# Altium footprint library NEW.PcbLib: 53 footprints (part 1 of 4)
Each footprint in its own frame and in the unit in brackets; x right, y up, seen from the top. Pads: shape width x height; smd on the part's side, far side on the other; paste and mask are expansions set on the pad; w line width, h text height; cw(c..) or ccw(c..) is an arc to the next point about the centre after c.
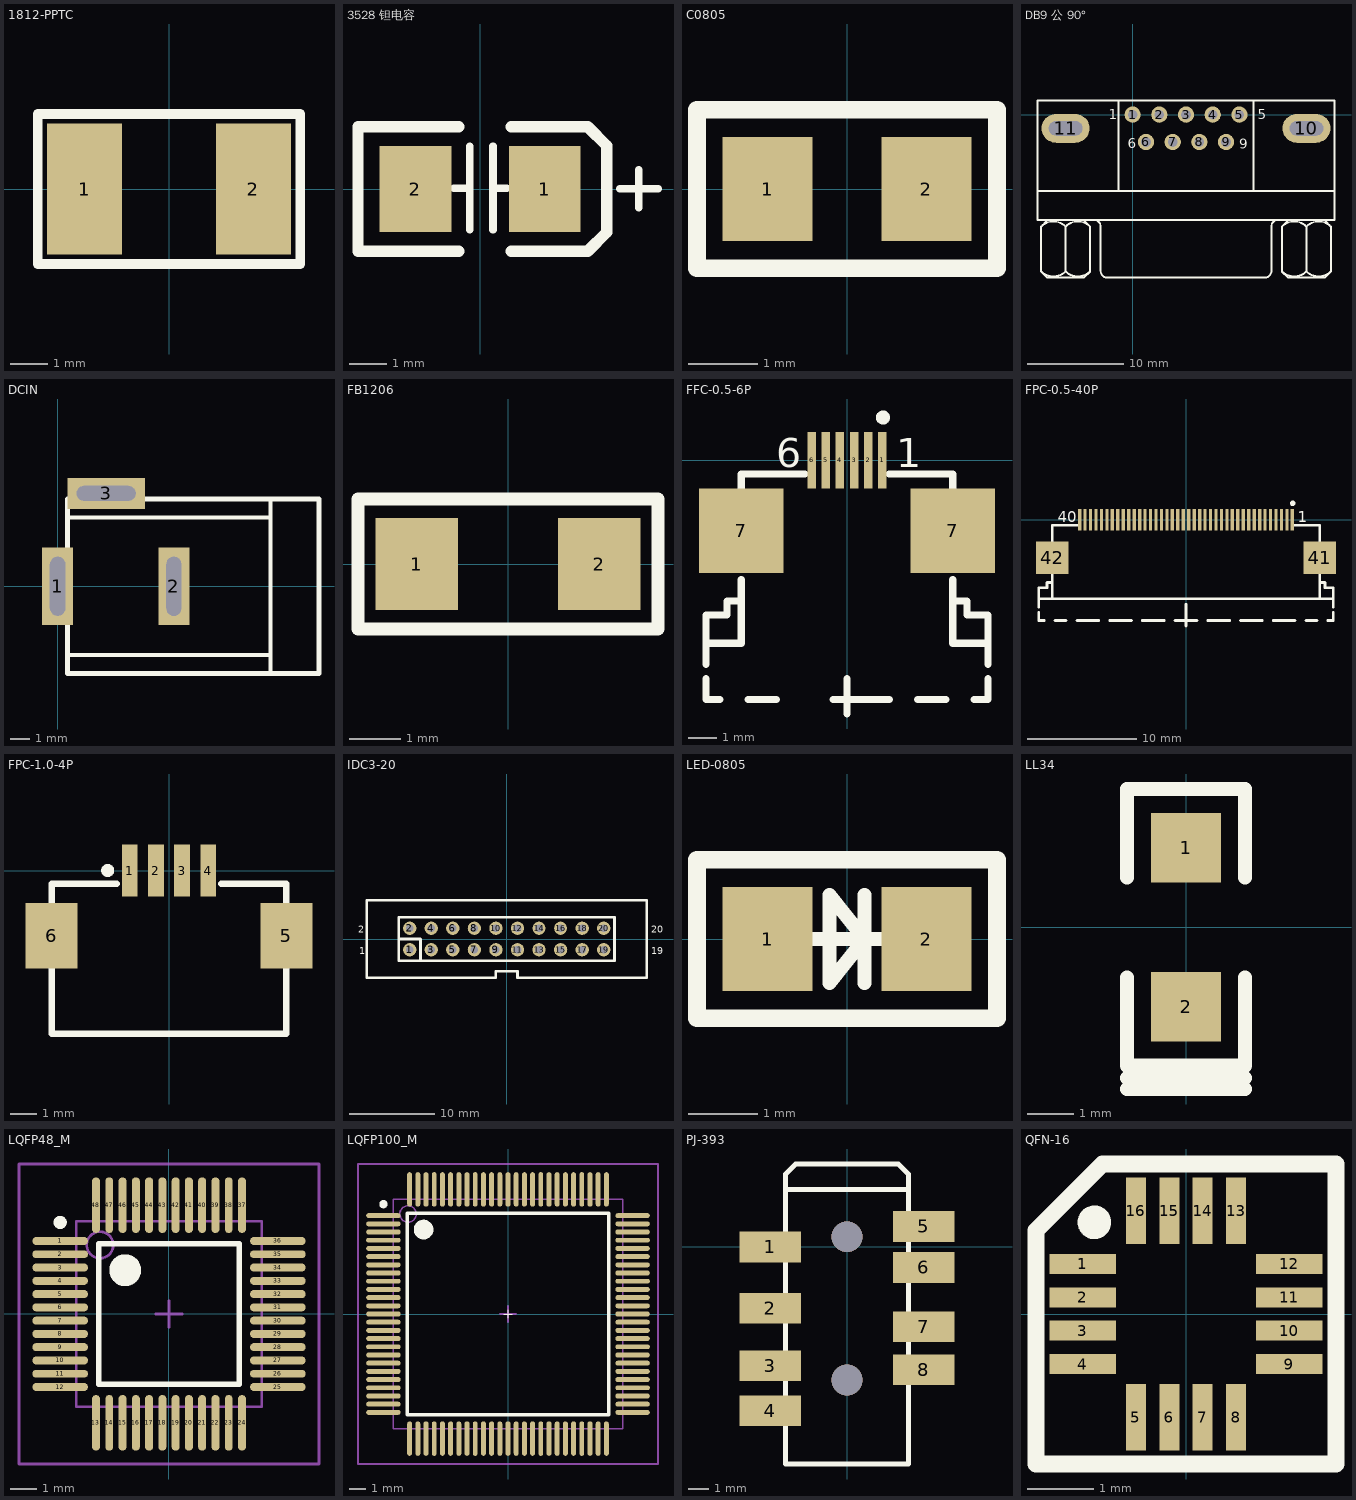
[diagram p0: the footprints below, top view; thin cyan lines are the x and y axes]

## 1812-PPTC [mm]
height 1
pads (2):
  rect 2x3.5 smd: 1(-2.25,0) 2(2.25,0)
Top Overlay:
  lines w0.254: -3.5,-2 -3.5,2 3.5,2 3.5,-2 -3.5,-2
3D body: height 1.32, standoff 0, extent -2.41,-1.61 2.41,1.61

## 3528 钽电容 [mil]
height 118.11
pads (2):
  rect 75x90 smd: 1(67.5,0) 2(-67.5,0)
Top Overlay:
  lines w7.87: 145.85,0.2 185.85,0.2 ; 165.85,-19.8 165.85,20.2
  lines w8: -27.38,0.79 -10.65,0.79 ; -10.65,-42.72 -10.65,44.69 ; 13.56,-42.72 13.56,44.69 ; 13.56,0.79 27.74,0.79
  lines w12: -22.5,-65 -127.5,-65 -127.5,65 -22.5,65 ; 32.5,-65 112.5,-65 132.5,-45 132.5,45 112.5,65 32.5,65
3D body: height 82.22, standoff -0.46, extent -72.65,-55.51 72.65,55.51

## C0805 [mm]
height 0.5
pads (2):
  rect 1.3x1.5 smd: 1(-1.143,0) 2(1.143,0)
Top Overlay:
  lines w0.254: -2.159,-1.143 2.159,-1.143 2.159,0.508 2.159,1.143 -2.159,1.143 -2.159,0.635 -2.159,-1.143
3D body: height 0.6, standoff 0, extent -1,-0.625 1,0.625

## DB9 公 90° [mm]
height 12.5
pads (11):
  round 1.69 hole 1: 1(0,0) 2(2.77,0) 3(5.54,0) 4(8.31,0) 5(11.08,0) 6(1.385,-2.84) 7(4.155,-2.84) 8(6.925,-2.84) 9(9.695,-2.84)
  oval 5x3 hole 1.5 slot 3.5 at 0 deg: 10(18.035,-1.42) 11(-6.955,-1.42)
Top Overlay:
  lines w0.2: -9.86,-7.92 20.94,-7.92 ; -9.502,-16.285 -8.867,-16.92 -5.057,-16.92 -4.422,-16.285 ; -9.502,-16.27 -9.502,-11.619 -8.867,-10.984 ; -9.502,-15.218 -9.502,-15.006 ; -6.962,-16.27 -6.962,-11.619 ; -5.057,-10.984 -4.422,-11.619 -4.422,-16.27 ; -4.02,-10.925 cw(c-4.02,-11.62) -3.325,-11.62 -3.325,-16.22 ; -3.32,-16.225 ccw(c-2.625,-16.225) -2.625,-16.92 13.705,-16.92 ccw(c13.705,-16.225) 14.4,-16.225 ; -1.46,-7.92 -1.46,1.48 ; 12.54,-7.92 12.54,1.48 ; 14.405,-16.22 14.405,-11.62 cw(c15.1,-11.62) 15.1,-10.925 ; 15.498,-16.285 16.133,-16.92 19.943,-16.92 20.578,-16.285 ; 15.498,-16.27 15.498,-11.619 16.133,-10.984 ; 15.498,-15.218 15.498,-15.006 ; 18.038,-16.27 18.038,-11.619 ; 19.943,-10.984 20.578,-11.619 20.578,-16.27 ; -9.86,-10.92 -9.86,1.48 20.94,1.48 20.94,-10.92 -9.86,-10.92
  lines w0.203: -9.504,-11.617 cw(c-8.232,-12.889) -6.96,-11.617 ; -9.502,-16.27 ccw(c-8.23,-14.998) -6.958,-16.27 ; -6.967,-16.27 ccw(c-5.694,-14.998) -4.422,-16.27 ; -6.964,-11.617 cw(c-5.692,-12.889) -4.42,-11.617 ; 15.496,-11.617 cw(c16.768,-12.889) 18.04,-11.617 ; 15.498,-16.27 ccw(c16.77,-14.998) 18.042,-16.27 ; 18.033,-16.27 ccw(c19.306,-14.998) 20.578,-16.27 ; 18.036,-11.617 cw(c19.308,-12.889) 20.58,-11.617
  text "6" at -0.5,-3.5 h1.02
  text "1" at -2.5,-0.5 h1.02
  text "5" at 13,-0.5 h1.02
  text "9" at 11.08,-3.55 h1.02
3D body: height 12.75, standoff -3.65, extent -9.71,-15.945 20.79,1.755

## DCIN [mm]
pads (3):
  rect 1.6x4 hole 0.8 slot 3.048 at 90 deg: 1(0,0)
  rect 1.6x4 hole 0.762 slot 3.048 at 90 deg: 2(6,0)
  rect 4x1.6 hole 0.762 slot 3.048 at 0 deg: 3(2.5,4.8)
Top Overlay:
  lines w0.2: 0.516,-3.556 11,-3.556 ; 0.516,3.556 11,3.556 ; 11,-4.5 11,4.5
  lines w0.254: 0.516,-4.5 13.5,-4.5 13.5,4.5 0.516,4.5 0.516,-4.5
3D body: height 11.2, standoff -3.3, extent -0.201,-4.503 13.625,5.003

## FB1206 [mm]
pads (2):
  rect 1.6x1.8 smd: 1(-1.778,0) 2(1.778,0)
Top Overlay:
  lines w0.254: -2.921,-1.27 -2.921,1.27 2.921,1.27 2.921,-1.27 -2.921,-1.27
3D body: height 1.1, standoff 0, extent -1.6,-0.8 1.6,0.8

## FFC-0.5-6P [mm]
height 1
pads (8):
  rect 0.3x2 smd: 1(1.25,0) 2(0.75,0) 3(0.25,0) 4(-0.25,0) 5(-0.75,0) 6(-1.25,0)
  rect 3x3 smd: 7(-3.75,-2.5) 7(3.75,-2.5)
Top Overlay:
  circle w0.25: c1.275,1.51 r0.125
  lines w0.254: -5,-7.74 -5,-8.49 -4.5,-8.49 ; -5,-7.24 -5,-6.49 ; -3.75,-4.99 -4.25,-4.99 -4.25,-5.49 -5,-5.49 -5,-6.49 ; -3.75,-4.24 -3.75,-6.49 -5,-6.49 ; -3.75,-1.99 -3.75,-0.49 -1.5,-0.49 ; -3.5,-8.49 -2.5,-8.49 ; -0.5,-8.49 1.5,-8.49 ; 0,-9 0,-7.75 ; 1.5,-0.49 3.75,-0.49 3.75,-1.99 ; 2.5,-8.49 3.5,-8.49 ; 3.75,-4.99 4.25,-4.99 4.25,-5.49 5,-5.49 5,-6.49 ; 3.75,-4.24 3.75,-6.49 5,-6.49 ; 4.5,-8.49 5,-8.49 5,-7.74 ; 5,-7.24 5,-6.49
  text "1" at 1.75,-0.25 h1.02
  text "6" at -2.5,-0.25 h1.02
3D body: height 2, standoff 0, extent -4.55,-6.45 4.55,-0.05

## FPC-0.5-40P [mm]
height 1
pads (42):
  rect 0.3x2 smd: 1(9.75,0) 2(9.25,0) 3(8.75,0) 4(8.25,0) 5(7.75,0) 6(7.25,0) 7(6.75,0) 8(6.25,0) 9(5.75,0) 10(5.25,0) 11(4.75,0) 12(4.25,0) 13(3.75,0) 14(3.25,0) 15(2.75,0) 16(2.25,0) 17(1.75,0) 18(1.25,0) 19(0.75,0) 20(0.25,0) 21(-0.25,0) 22(-0.75,0) 23(-1.25,0) 24(-1.75,0) 25(-2.25,0) 26(-2.75,0) 27(-3.25,0) 28(-3.75,0) 29(-4.25,0) 30(-4.75,0) 31(-5.25,0) 32(-5.75,0) 33(-6.25,0) 34(-6.75,0) 35(-7.25,0) 36(-7.75,0) 37(-8.25,0) 38(-8.75,0) 39(-9.25,0) 40(-9.75,0)
  rect 3x3 smd: 41(12.25,-3.49) 42(-12.25,-3.49)
Top Overlay:
  circle w0.25: c9.775,1.51 r0.125
  lines w0.254: -13.5,-8.49 -13.5,-9.24 -13,-9.24 ; -13.5,-7.99 -13.5,-7.24 ; -12.25,-5.74 -12.75,-5.74 -12.75,-6.24 -13.5,-6.24 -13.5,-7.24 ; -12.25,-4.99 -12.25,-7.24 ; -12.25,-1.99 -12.25,-0.49 -10,-0.49 ; -12,-9.24 -11,-9.24 ; -10,-9.24 -8,-9.24 ; -7,-9.24 -5,-9.24 ; -4,-9.24 -2,-9.24 ; -1,-9.24 1,-9.24 ; 0,-9.74 0,-7.74 ; 2,-9.24 4,-9.24 ; 5,-9.24 7,-9.24 ; 8,-9.24 10,-9.24 ; 10,-0.49 12.25,-0.49 12.25,-1.99 ; 11,-9.24 12,-9.24 ; 12.25,-5.74 12.75,-5.74 12.75,-6.24 13.5,-6.24 13.5,-7.24 ; 12.25,-4.99 12.25,-7.24 ; 13,-9.24 13.5,-9.24 13.5,-8.49 ; 13.5,-7.99 13.5,-7.24 ; -13.5,-7.24 -12.25,-7.24 ; -12.25,-7.24 12.25,-7.24 ; 12.25,-7.24 13.5,-7.24
  text "1" at 10.25,-0.24 h1.02
  text "40" at -11.75,-0.24 h1.02
3D body: height 2.05, standoff -0.05, extent -12.75,-5.5 12.75,-0.164

## FPC-1.0-4P [mm]
height 1
pads (6):
  rect 0.6x2 smd: 1(-1.5,0) 2(-0.5,0) 3(0.5,0) 4(1.5,0)
  rect 2x2.5 smd: 5(4.5,-2.5) 6(-4.5,-2.5)
Top Overlay:
  circle w0.25: c-2.35,0 r0.125
  lines w0.254: -4.5,-3.75 -4.5,-6.25 4.5,-6.25 4.5,-3.75 ; -4.5,-1.25 -4.5,-0.5 -2,-0.5 ; 2,-0.5 4.5,-0.5 4.5,-1.25
3D body: height 2.65, standoff -0.05, extent -5.15,-8.475 5.15,0.425

## IDC3-20 [mil]
height 393.7
pads (20):
  round 62 hole 35.43: 1(-450,-50) 2(-450,50) 3(-350,-50) 4(-350,50) 5(-250,-50) 6(-250,50) 7(-150,-50) 8(-150,50) 9(-50,-50) 10(-50,50) 11(50,-50) 12(50,50) 13(150,-50) 15(250,-50) 17(350,-50) 18(350,50) 19(450,-50) 20(450,50)
  oval 59.06x62 / inner round 62 / far side round 62 hole 35.43: 14(150,50) 16(250,50)
Top Overlay:
  lines w12: -500,0 -400,0 -400,-100 ; -650,-180 -650,180 450,180 650,180 650,-180 211.61,-180 50,-180 50,-150 0,-150 -50,-150 -50,-180 -650,-180 ; -500,-100 300,-100 500,-100 500,100 300,100 -500,100 -500,-100
  text "1" at -685,-70 h32
  text "2" at -690,30 h32
  text "19" at 670,-70 h32
  text "20" at 670,30 h32
3D body: height 354.33, standoff -137.93, extent -650,-171.46 650,175

## LED-0805 [mm]
pads (2):
  rect 1.3x1.5 smd: 1(-1.143,0) 2(1.143,0)
Top Overlay:
  lines w0.203: -0.508,0 0.508,0 ; 0.254,-0.635 0.254,0.635 ; -0.254,-0.635 0.254,0 -0.254,0.635 -0.254,-0.635
  lines w0.254: -2.159,-1.143 2.159,-1.143 2.159,1.143 -2.159,1.143 -2.159,-1.143
3D body: height 0.85, standoff 0.01, extent -1.042,-0.453 1.021,0.453

## LL34 [mm]
pads (2):
  rect 1.5x1.5 smd: 1(0,1.714) 2(0,-1.714)
Top Overlay:
  lines w0.305: -1.27,-3.484 1.27,-3.484 ; -1.27,-3.244 1.27,-3.244 ; -1.27,-1.079 -1.27,-2.984 1.27,-2.984 1.27,-1.079 ; -1.27,1.079 -1.27,2.984 1.27,2.984 1.27,1.079
3D body: height 1.43, standoff -0.02, extent -0.725,-1.75 0.725,1.75

## LQFP48_M [mm]
pads (48):
  oval 2.1x0.3 smd: 1(-4.1,2.75) 2(-4.1,2.25) 3(-4.1,1.75) 4(-4.1,1.25) 5(-4.1,0.75) 6(-4.1,0.25) 7(-4.1,-0.25) 8(-4.1,-0.75) 9(-4.1,-1.25) 10(-4.1,-1.75) 11(-4.1,-2.25) 12(-4.1,-2.75) 25(4.1,-2.75) 26(4.1,-2.25) 27(4.1,-1.75) 28(4.1,-1.25) 29(4.1,-0.75) 30(4.1,-0.25) 31(4.1,0.25) 32(4.1,0.75) 33(4.1,1.25) 34(4.1,1.75) 35(4.1,2.25) 36(4.1,2.75)
  oval 0.3x2.1 smd: 13(-2.75,-4.1) 14(-2.25,-4.1) 15(-1.75,-4.1) 16(-1.25,-4.1) 17(-0.75,-4.1) 18(-0.25,-4.1) 19(0.25,-4.1) 20(0.75,-4.1) 21(1.25,-4.1) 22(1.75,-4.1) 23(2.25,-4.1) 24(2.75,-4.1) 37(2.75,4.1) 38(2.25,4.1) 39(1.75,4.1) 40(1.25,4.1) 41(0.75,4.1) 42(0.25,4.1) 43(-0.25,4.1) 44(-0.75,4.1) 45(-1.25,4.1) 46(-1.75,4.1) 47(-2.25,4.1) 48(-2.75,4.1)
Top Overlay:
  circle w0.25: c-4.1,3.45 r0.125
  circle w0.6: c-1.65,1.65 r0.3
  lines w0.2: -2.65,-2.65 -2.65,2.65 2.65,2.65 2.65,-2.65 -2.65,-2.65
Mechanical 13:
  circle w0.1: c-2.6,2.6 r0.5
  lines w0.1: -3.5,-3.5 -3.5,3.5 3.5,3.5 3.5,-3.5 -3.5,-3.5
Mechanical 15:
  lines w0.1: -0.5,0 0.5,0 ; 0,-0.5 0,0.5 ; -5.65,-5.65 -5.65,5.65 5.65,5.65 5.65,-5.65 -5.65,-5.65
3D body: height 1.5, standoff 0, extent -4.5,-4.5 4.5,4.5

## LQFP100_M [mm]
pads (100):
  oval 2.1x0.3 smd: 1(-7.6,6) 2(-7.6,5.5) 3(-7.6,5) 4(-7.6,4.5) 5(-7.6,4) 6(-7.6,3.5) 7(-7.6,3) 8(-7.6,2.5) 9(-7.6,2) 10(-7.6,1.5) 11(-7.6,1) 12(-7.6,0.5) 13(-7.6,0) 14(-7.6,-0.5) 15(-7.6,-1) 16(-7.6,-1.5) 17(-7.6,-2) 18(-7.6,-2.5) 19(-7.6,-3) 20(-7.6,-3.5) 21(-7.6,-4) 22(-7.6,-4.5) 23(-7.6,-5) 24(-7.6,-5.5) 25(-7.6,-6) 51(7.6,-6) 52(7.6,-5.5) 53(7.6,-5) 54(7.6,-4.5) 55(7.6,-4) 56(7.6,-3.5) 57(7.6,-3) 58(7.6,-2.5) 59(7.6,-2) 60(7.6,-1.5) 61(7.6,-1) 62(7.6,-0.5) 63(7.6,0) 64(7.6,0.5) 65(7.6,1) 66(7.6,1.5) 67(7.6,2) 68(7.6,2.5) 69(7.6,3) 70(7.6,3.5) 71(7.6,4) 72(7.6,4.5) 73(7.6,5) 74(7.6,5.5) 75(7.6,6)
  oval 0.3x2.1 smd: 26(-6,-7.6) 27(-5.5,-7.6) 28(-5,-7.6) 29(-4.5,-7.6) 30(-4,-7.6) 31(-3.5,-7.6) 32(-3,-7.6) 33(-2.5,-7.6) 34(-2,-7.6) 35(-1.5,-7.6) 36(-1,-7.6) 37(-0.5,-7.6) 38(0,-7.6) 39(0.5,-7.6) 40(1,-7.6) 41(1.5,-7.6) 42(2,-7.6) 43(2.5,-7.6) 44(3,-7.6) 45(3.5,-7.6) 46(4,-7.6) 47(4.5,-7.6) 48(5,-7.6) 49(5.5,-7.6) 50(6,-7.6) 76(6,7.6) 77(5.5,7.6) 78(5,7.6) 79(4.5,7.6) 80(4,7.6) 81(3.5,7.6) 82(3,7.6) 83(2.5,7.6) 84(2,7.6) 85(1.5,7.6) 86(1,7.6) 87(0.5,7.6) 88(0,7.6) 89(-0.5,7.6) 90(-1,7.6) 91(-1.5,7.6) 92(-2,7.6) 93(-2.5,7.6) 94(-3,7.6) 95(-3.5,7.6) 96(-4,7.6) 97(-4.5,7.6) 98(-5,7.6) 99(-5.5,7.6) 100(-6,7.6)
Top Overlay:
  circle w0.6: c-5.15,5.15 r0.3
  circle w0.25: c-7.6,6.7 r0.125
  lines w0.025: -0.254,0 0.254,0 ; 0,-0.254 0,0.254
  lines w0.2: -6.15,-6.15 6.15,-6.15 6.15,6.15 -6.15,6.15 -6.15,-6.15
Mechanical 13:
  circle w0.1: c-6.1,6.1 r0.5
  lines w0.1: -7,-7 7,-7 7,7 -7,7 -7,-7
Mechanical 15:
  lines w0.1: -0.5,0 0.5,0 ; 0,-0.5 0,0.5 ; -9.15,-9.15 9.15,-9.15 9.15,9.15 -9.15,9.15 -9.15,-9.15
3D body: height 1.6, standoff 0, extent -8,-8 8,8

## PJ-393 [mm] "3.5mm 音频连接器 4节"
height 5
pads (8):
  rect 3x1.5 smd: 1(-3.75,0) 2(-3.75,-3) 3(-3.75,-5.8) 4(-3.75,-8) 5(3.75,1) 6(3.75,-1) 7(3.75,-3.9) 8(3.75,-6)
via 0,-6.5 diameter 1.5 hole 1.5
via 0,0.5 diameter 1.5 hole 1.5
Top Overlay:
  lines w0.254: -3,2.8 -3,-10.6 3,-10.6 3,2.8 ; -3,2.8 3,2.8 ; -3,2.8 -3,2.8 ; -3,2.8 -3,3.55 -2.5,4.05 2.5,4.05 3,3.55 3,2.8
3D body: height 5.25, standoff -0.75, extent -4.5,-10.5 4.5,6.5

## QFN-16 [mm]
height 0.9
pads (16):
  rect 1x0.3 smd: 1(-1.55,0.75) 2(-1.55,0.25) 3(-1.55,-0.25) 4(-1.55,-0.75) 9(1.55,-0.75) 10(1.55,-0.25) 11(1.55,0.25) 12(1.55,0.75)
  rect 0.3x1 smd: 5(-0.75,-1.55) 6(-0.25,-1.55) 7(0.25,-1.55) 8(0.75,-1.55) 13(0.75,1.55) 14(0.25,1.55) 15(-0.25,1.55) 16(-0.75,1.55)
Top Overlay:
  circle w0.254: c-1.375,1.375 r0.125
  lines w0.254: -2.25,-2.25 2.25,-2.25 2.25,2.25 -1.25,2.25 -2.25,1.25 -2.25,-2.25
3D body: height 0.92, standoff 0, extent -1.5,-1.5 1.5,1.5